# Altium schematic symbol library 724452_RPL-HX_Mobile_AEP_Rev0p91_Library.SchLib: 162 symbols (part 3 of 5)
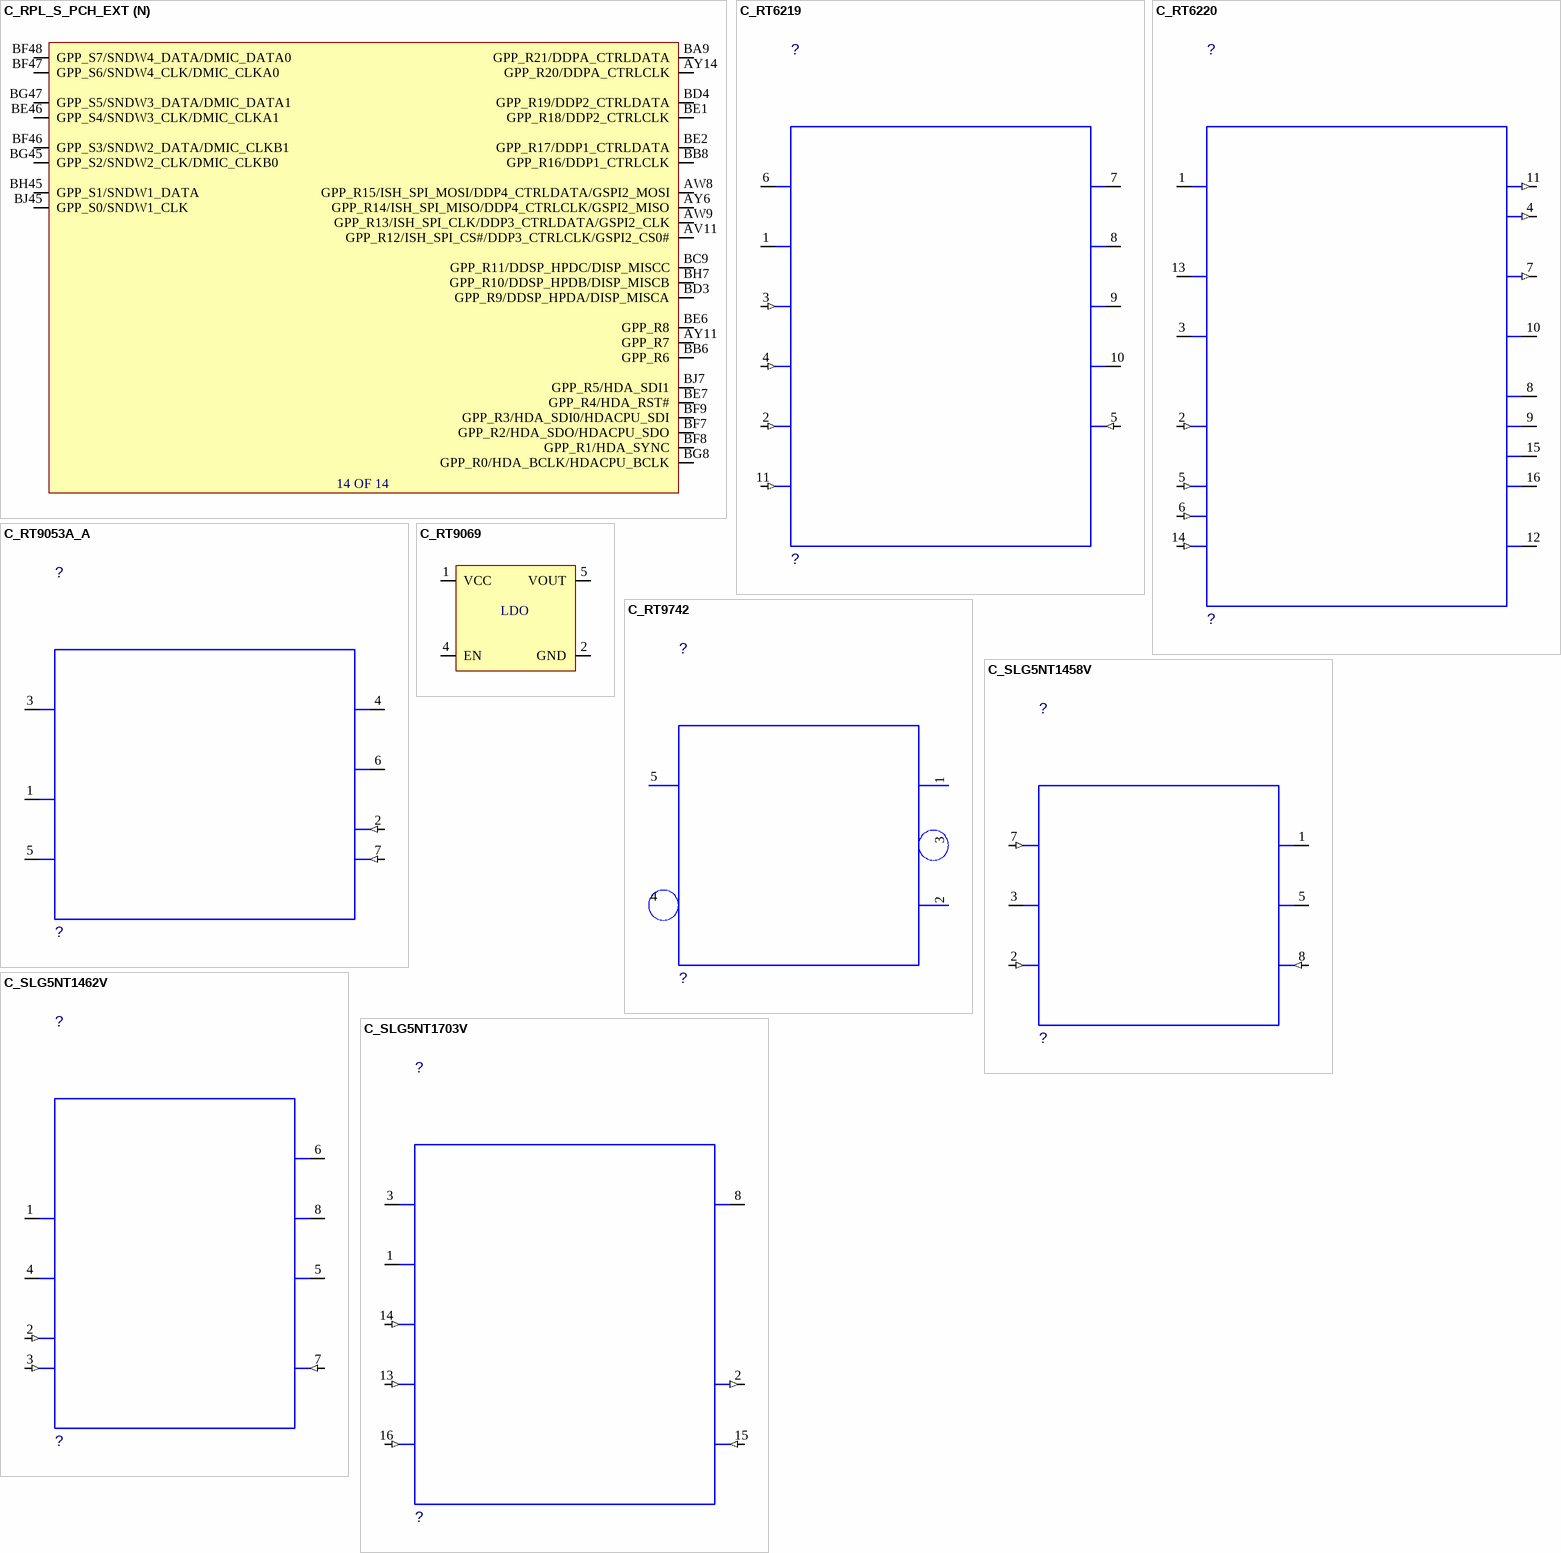
[diagram p45: symbols C_RPL_S_PCH_EXT to C_SLG5NT1703V]

## C_RPL_S_PCH_EXT
designator ?  (value not drawn)
Manufacturer Part Number: *; Case/Package: *
part A pins: A3 VSS_3, A4 VSS_5, A20 VSS_2, A31 VSS_4, A40 VSS_6, A52 VSS_7, A53 VSS_8, A54 VSS_9, AB1 VSS_10, AB5 VSS_26, AB12 VSS_11, AB13 VSS_12, AB15 VSS_13, AB20 VSS_14, AB22 VSS_15, AB23 VSS_16, AB25 VSS_17, AB26 VSS_18, AB28 VSS_19, AB30 VSS_20, AB31 VSS_21, AB33 VSS_22, AB38 VSS_23, AB40 VSS_24, AB44 VSS_25, AB55 VSS_27, AC20 VSS_28, AC22 VSS_29, AC34 VSS_30, AD5 VSS_37, AD9 VSS_39, AD11 VSS_31, AD38 VSS_32, AD40 VSS_33, AD41 VSS_34, AD43 VSS_35, AD44 VSS_36, AD51 VSS_38, AE1 VSS_40, AE22 VSS_41, AE23 VSS_42, AE34 VSS_43, AE55 VSS_44, AF5 VSS_54, AF6 VSS_56, AF8 VSS_57, AF12 VSS_45, AF13 VSS_46, AF15 VSS_47, AF16 VSS_48, AF38 VSS_49, AF40 VSS_50, AF41 VSS_51, AF43 VSS_52, AF44 VSS_53, AF51 VSS_55, AG22 VSS_58, AG23 VSS_59, AG26 VSS_60, AG28 VSS_61, AG30 VSS_62, AG31 VSS_63, AG33 VSS_64, AG34 VSS_65, AH1 VSS_66, AH12 VSS_67, AH16 VSS_68, AH22 VSS_70, AH23 VSS_71, AH26 VSS_72, AH38 VSS_73, AH40 VSS_74, AH44 VSS_75, AH55 VSS_76, AK12 VSS_77, AK20 VSS_78, AK26 VSS_79, AK28 VSS_80, AK30 VSS_81, AK31 VSS_82, AK33 VSS_83, AK34 VSS_84, AK38 VSS_85, AK40 VSS_86, AK44 VSS_87, AL5 VSS_88, AL51 VSS_89, AM12 VSS_90, AM31 VSS_91, AM40 VSS_92, AM44 VSS_93, AN1 VSS_94, AN19 VSS_95, AN21 VSS_96, AN23 VSS_97, AN25 VSS_98, AN27 VSS_99, AN31 VSS_100, AN37 VSS_103, AN55 VSS_104, AP12 VSS_105, AP16 VSS_106, AP40 VSS_107, AP44 VSS_108, AR17 VSS_109, B1 VSS_143, B2 VSS_144, B54 VSS_149, B55 VSS_150, BG7 VSS_196, BH4 VSS_198, BH5 VSS_199, BH54 VSS_200, BH55 VSS_201, BJ3 VSS_204, BJ4 VSS_205, C1 VSS_208, C55 VSS_219, D1 VSS_221, D55 VSS_235
part B pins: AV19 VSS_127, AV21 VSS_128, AV23 VSS_129, AV25 VSS_130, AV27 VSS_131, AV29 VSS_132, AV31 VSS_133, AV33 VSS_134, AV35 VSS_135, AV37 VSS_136, AV39 VSS_137, AV45 VSS_138, AW5 VSS_141, AW12 VSS_139, AW13 VSS_140, AW51 VSS_142, B4 VSS_145, B5 VSS_146, B51 VSS_147, B52 VSS_148, BB1 VSS_151, BB10 VSS_152, BB23 VSS_153, BB27 VSS_154, BB29 VSS_155, BB33 VSS_156, BB46 VSS_157, BB55 VSS_158, BC10 VSS_159, BC46 VSS_160, BD5 VSS_162, BD7 VSS_164, BD49 VSS_161, BD51 VSS_163, BE4 VSS_174, BE9 VSS_180, BE14 VSS_165, BE16 VSS_166, BE18 VSS_167, BE31 VSS_169, BE36 VSS_171, BE38 VSS_173, BE40 VSS_175, BE42 VSS_176, BE44 VSS_177, BE47 VSS_178, BE52 VSS_179, BF32 VSS_184, BF36 VSS_186, BF40 VSS_187, BF45 VSS_188, BG20 VSS_189, BG24 VSS_190, BG32 VSS_193, BG53 VSS_195, BH20 VSS_197, BJ11 VSS_202, BJ20 VSS_203, BJ40 VSS_206, BJ49 VSS_207, C3 VSS_212, C5 VSS_216, C7 VSS_220, C17 VSS_209, C27 VSS_210, C28 VSS_211, C36 VSS_213, C45 VSS_214, C49 VSS_215, C51 VSS_217, C53 VSS_218, D2 VSS_223, D7 VSS_236, D17 VSS_222, D27 VSS_224, D32 VSS_225, D33 VSS_226, D36 VSS_227, D37 VSS_228, D40 VSS_229, D42 VSS_230, D45 VSS_231, D46 VSS_232, D52 VSS_233, D54 VSS_234, E7 VSS_257, E9 VSS_258, E10 VSS_237, E14 VSS_238, E16 VSS_239, E18 VSS_240, E22 VSS_241, E23 VSS_242, E31 VSS_243, E33 VSS_244, E36 VSS_245, E37 VSS_246, E38 VSS_247, E40 VSS_248, E41 VSS_249, E42 VSS_250, E44 VSS_251, E46 VSS_252, E47 VSS_253, E49 VSS_254, E52 VSS_255, E54 VSS_256, F49 VSS_260, F51 VSS_261, G5 VSS_262, H8 VSS_272, H10 VSS_263, H27 VSS_264, H29 VSS_265, H33 VSS_267, H46 VSS_268, H48 VSS_269, H50 VSS_270, H55 VSS_271, U35 VSS_345
part C pins: A2 VSS_1, AH18 VSS_69, AN33 VSS_101, AN35 VSS_102, AR5 VSS_114, AR19 VSS_110, AR27 VSS_111, AR33 VSS_112, AR35 VSS_113, AR51 VSS_115, AT12 VSS_116, AT17 VSS_117, AT19 VSS_118, AT27 VSS_119, AT33 VSS_120, AT35 VSS_121, AT39 VSS_122, AT44 VSS_123, AU1 VSS_124, AU55 VSS_125, AV17 VSS_126, BE25 VSS_168, BE33 VSS_170, BE37 VSS_172, BF16 VSS_181, BF24 VSS_182, BF29 VSS_183, BF33 VSS_185, BG5 VSS_194, BG28 VSS_191, BG29 VSS_192, F4 VSS_259, H3 VSS_266, J9 VSS_277, J16 VSS_273, J21 VSS_274, J43 VSS_275, J47 VSS_276, K4 VSS_280, K11 VSS_278, K16 VSS_279, K42 VSS_281, K45 VSS_282, K50 VSS_283, L5 VSS_291, L12 VSS_284, L13 VSS_285, L21 VSS_286, L43 VSS_287, L44 VSS_288, L47 VSS_289, L48 VSS_290, L51 VSS_292, M5 VSS_309, M12 VSS_293, M13 VSS_294, M17 VSS_295, M23 VSS_296, M25 VSS_297, M27 VSS_298, M29 VSS_299, M31 VSS_300, M33 VSS_301, M35 VSS_302, M37 VSS_303, M39 VSS_304, M41 VSS_305, M43 VSS_306, M44 VSS_307, M45 VSS_308, N1 VSS_310, N55 VSS_311, P12 VSS_312, P23 VSS_313, P27 VSS_314, P29 VSS_315, P35 VSS_316, P39 VSS_317, P41 VSS_318, P43 VSS_319, P44 VSS_320, R5 VSS_327, R19 VSS_321, R21 VSS_322, R23 VSS_323, R27 VSS_324, R29 VSS_325, R35 VSS_326, R51 VSS_328, T5 VSS_336, T12 VSS_329, T13 VSS_330, T15 VSS_331, T16 VSS_332, T40 VSS_333, T41 VSS_334, T44 VSS_335, U2 VSS_337, U21 VSS_338, U23 VSS_339, U25 VSS_340, U27 VSS_341, U29 VSS_342, U31 VSS_343, U33 VSS_344, U37 VSS_346, U55 VSS_347, V12 VSS_348, V16 VSS_349, V18 VSS_350, V21 VSS_351, V38 VSS_352, V43 VSS_353, W5 VSS_354, W51 VSS_355, Y12 VSS_356, Y20 VSS_357, Y22 VSS_358, Y38 VSS_359, Y40 VSS_360, Y44 VSS_361
part D pins: AB34 VCCHSIO_0P82_1 (power), AB36 VCCHSIO_0P82_2 (power), AC23 VCCDUSB_0P82 (power), AC25 VCCPRIM_CORE_0P82_1 (power), AC26 VCCPRIM_CORE_0P82_2 (power), AC28 VCCPRIM_CORE_0P82_3 (power), AC30 VCCPRIM_CORE_0P82_4 (power), AC31 VCCPRIM_CORE_0P82_5 (power), AC33 VCCPRIM_CORE_0P82_6 (power), AC36 VCCHSIO_0P82_3 (power), AD15 VCCPRIM_1P05 (power), AE25 VCCPRIM_CORE_0P82_7 (power), AE26 VCCPRIM_CORE_0P82_8 (power), AE28 VCCPRIM_CORE_0P82_9 (power), AE30 VCCPRIM_CORE_0P82_10 (power), AE31 VCCPRIM_CORE_0P82_11 (power), AE33 VCCPRIM_CORE_0P82_12 (power), AE36 VCCHSIO_0P82_4 (power), AF18 VCCPGPPD (power), AG25 VCCPRIM_0P82_1 (power), AG36 VCCHSIO_0P82_5 (power), AH20 VCCPRIM_1P8_1 (power), AH25 VCCPRIM_0P82_2 (power), AH28 VCCHSIO_0P82_6 (power), AH30 VCCHSIO_0P82_7 (power), AH31 VCCHSIO_0P82_8 (power), AH33 VCCHSIO_0P82_9 (power), AH34 VCCHSIO_0P82_10 (power), AH36 VCCHSIO_0P82_11 (power), AH41 VCCSPI (power), AK16 VCCA_XTAL_PLL_1P8_1 (power), AK18 VCCA_XTAL_PLL_1P8_2 (power), AK22 VCCAHSIOPLL_1P8_1 (power), AK23 VCCAHSIOPLL_1P8_2 (power), AK25 VCCAHSIOPLL_1P8_3 (power), AK36 VCCPRIM_0P82_3 (power), AM16 VCCA_XTAL_PLL_1P8_3 (power), AM18 VCCA_XTAL_PLL_1P8_4 (power), AM21 VCCPRIM_1P8_2 (power), AM23 VCCPRIM_1P8_3 (power), AM38 VCCPGPPA (power), AR39 VCCPGPPEFK (power), AV15 VCCPGPPIR (power), AV41 VCCPRIM_3P3 (power), AV44 DCPRTC (power), BE54 VCCDSW_3P3_1 (power), BF1 DCPCNVILDO2_1 (power), BF2 DCPCNVILDO2_2 (power), BF4 DCPCNVILDO1 (power), BF54 VCCDSW_3P3_2 (power), BF55 VCCDSW_3P3_3 (power), BG1 DCPCNVILDO2_3 (power), BG3 DCPCNVILDO2_4 (power), BG55 VCCDSW_3P3_4 (power), BH1 DCPCNVILDO2_5 (power), BH2 DCPCNVILDO2_6 (power), BH51 VCCRTC_1 (power), BH52 VCCRTC_2 (power), BJ2 DCPCNVILDO2_7 (power), BJ52 VCCRTC_3 (power), BJ53 VCCRTC_4 (power), BJ54 VCCRTC_5 (power), M15 VCCA_XTAL_PLL_0P82_1 (power), P13 VCCA_XTAL_PLL_0P82_2 (power), P15 VCCA_XTAL_PLL_0P82_3 (power), P17 VCCA_XTAL_PLL_0P82_4 (power), R17 VCCA_XTAL_PLL_0P82_5 (power), T43 VCCPGPPGH (power), U19 VCCA_XTAL_PLL_0P82_6 (power), V23 VCCHSIO_0P82_12 (power), V25 VCCHSIO_0P82_13 (power), V27 VCCHSIO_0P82_14 (power), V29 VCCHSIO_0P82_15 (power), V31 VCCHSIO_0P82_16 (power), V33 VCCHSIO_0P82_17 (power), V35 VCCHSIO_0P82_18 (power), Y23 VCCHSIO_0P82_19 (power), Y25 VCCHSIO_0P82_20 (power), Y26 VCCHSIO_0P82_21 (power), Y28 VCCHSIO_0P82_22 (power), Y30 VCCHSIO_0P82_23 (power), Y31 VCCHSIO_0P82_24 (power), Y33 VCCHSIO_0P82_25 (power), Y34 VCCHSIO_0P82_26 (power), Y36 VCCHSIO_0P82_27 (power), Y41 VCCPGPPBC (power)
part E pins: AA2 PCH_JTAG_TDI, AA3 PCH_JTAG_TDO, AA4 PCH_JTAG_TCK, AB16 RSVD_1, AB18 RSVD_2, AC3 TRIGGER_IN, AC4 PCH_JTAG_TMS, AD3 PREQ#, AD4 PCH_JTAGX, AD12 RSVD_18, AD13 RSVD_19, AE2 PRDY#, AE3 TRIGGER_OUT, AE20 RSVD_3, AF3 DBG_PMODE, AF4 CPU_TRST#, AG20 RSVD_4, AJ45 SPI0_CLK, AJ47 SPI0_CS2#, AK6 GPD7, AK8 GPD3/PWRBTN#, AK41 SPI0_MISO, AK43 SPI0_IO3, AK48 SPI0_MOSI, AK50 SPI0_IO2, AM9 DRAM_RESET#, AM11 GPD5/SLP_S4#, AM25 RSVD_5, AM27 RSVD_6, AM33 RSVD_8, AM35 RSVD_9, AM41 SPI0_CS0#, AM43 SPI0_CS1#, AN2 GPD2/LAN_WAKE#, AN3 GPD0/BATLOW#, AN4 GPD10/SLP_S5#, AN5 GPD12, AN6 PCH_PWROK, AN8 DSW_PWROK, AP4 GPD4/SLP_S3#, AP5 GPD1/ACPRESENT, AP13 GPD8/SUSCLK, AP15 GPD9/SLP_WLAN#, AR3 GPD11/LANPHYPC, AR4 GPD6/SLP_A#, AR9 SLP_LAN#, AR11 SLP_SUS#, AT3 HDACPU_BCLK, AT4 HDACPU_SDO, AT13 WAKE#, AT15 RSMRST#, AU4 SRTCRST#, AU5 HDACPU_SDI, AU52 SYS_RESET#, AV2 RTCX2, AV3 RTCX1, AV5 CL_CLK, AV13 INTRUDER#, AV53 CL_RST#, AV54 SYS_PWROK, AW3 CL_DATA, AW4 RTCRST#, BE55 SNDW_RCOMP, P37 RSVD_13, R37 RSVD_16, R39 RSVD_17, U4 CPUPWRGD, U5 C10_WAKE, V3 PECI, V4 PM_DOWN, W4 VCCST_OVERRIDE, Y3 PLTRST_CPU#, Y4 THRMTRIP#, Y5 PM_SYNC
part F pins: A11 USB2P_7, A16 USB2N_2, A25 USB32_7_TXP, B11 USB2N_7, B15 USB2P_2, B20 USB32_3_TXP, B24 USB32_7_TXN, B28 USB32_COMP, C9 USB2_COMP1, C11 USB2N_8, C12 USB2N_5, C14 USB2P_4, C15 USB2N_1, C18 USB32_1_TXN, C20 USB32_3_TXN, C21 USB32_5_TXN, C23 USB32_6_TXN, C24 USB32_8_TXP, C26 USB32_10_TXP, D4 USB2N_9, D9 USB2_COMP2, D10 USB2P_8, D11 USB2N_6, D12 USB2P_5, D13 USB2N_4, D14 USB2P_3, D16 USB2P_1, D18 USB32_1_TXP, D19 USB32_2_TXP, D20 USB32_4_TXP, D21 USB32_5_TXP, D22 USB32_6_TXP, D23 USB32_8_TXN, D24 USB32_9_TXN, D26 USB32_10_TXN, E1 USB_ID1, E2 USB_ID2, E4 USB2P_9, E6 USB2N_10, E12 USB2P_6, E15 USB2N_3, E19 USB32_2_TXN, E20 USB32_4_TXN, E25 USB32_9_TXP, F5 USB2P_10, F7 USB2N_11, F12 USB32_1_RXN, F14 USB32_3_RXN, F17 USB32_5_RXP, F20 USB32_7_RXP, F23 USB32_9_RXN, G9 USB2P_12, G10 USB2N_12, H6 USB2P_11, H13 USB32_1_RXP, H15 USB32_3_RXP, H18 USB32_5_RXN, H20 USB32_7_RXN, H23 USB32_9_RXP, J13 USB32_2_RXP, J18 USB32_4_RXP, J24 USB32_10_RXN, K6 USB2P_14, K14 USB32_2_RXN, L8 USB2N_14, L9 USB2N_13, L19 USB32_4_RXN, L24 USB32_10_RXP, M11 USB2P_13, M19 USB32_6_RXP, M21 USB32_8_RXN, P19 USB32_6_RXN, P21 USB32_8_RXP, P25 RSVD_11, R25 RSVD_14
part G pins: A36 PCIE26_TXP, AM29 RSVD_7, AN29 RSVD_10, AR21 PCIE2_RXN, AR23 PCIE3_RXP, AR25 PCIE6_RXN, AR29 PCIE9_RXN, AR31 PCIE12_RXP, AR37 PCIE19_RXN/SATA6_RXN, AT21 PCIE2_RXP, AT23 PCIE3_RXN, AT25 PCIE6_RXP, AT29 PCIE9_RXP, AT31 PCIE12_RXN, AT37 PCIE19_RXP/SATA6_RXP, AW24 PCIE5_RXP, AW27 PCIE8_RXP, AW29 PCIE10_RXP, AW32 PCIE13_RXP/SATA0_RXP, AW35 PCIE15_RXN/SATA2_RXN, AW37 PCIE17_RXN/SATA4_RXN, B32 PCIE23_TXN, B36 PCIE26_TXN, BA24 PCIE5_RXN, BA27 PCIE8_RXN, BA29 PCIE10_RXN, BA32 PCIE13_RXN/SATA0_RXN, BA35 PCIE15_RXP/SATA2_RXP, BA38 PCIE17_RXP/SATA4_RXP, BB20 PCIE1_RXP, BB36 PCIE16_RXP/SATA3_RXP, BB38 PCIE18_RXP/SATA5_RXP, BB41 PCIE20_RXN/SATA7_RXN, BD20 PCIE1_RXN, BD23 PCIE4_RXP, BD27 PCIE7_RXP, BD29 PCIE11_RXP, BD33 PCIE14_RXP/SATA1_RXP, BD36 PCIE16_RXN/SATA3_RXN, BD39 PCIE18_RXN/SATA5_RXN, BD42 PCIE20_RXP/SATA7_RXP, BE20 PCIE1_TXP, BE22 PCIE4_RXN, BE23 PCIE4_TXN, BE27 PCIE7_RXN, BE29 PCIE11_RXN, BE34 PCIE14_RXN/SATA1_RXN, BE41 PCIE18_TXN/SATA5_TXN, BF20 PCIE1_TXN, BF21 PCIE2_TXN, BF22 PCIE3_TXN, BF23 PCIE4_TXP, BF26 PCIE6_TXP, BF27 PCIE7_TXN, BF30 PCIE9_TXP, BF34 PCIE11_TXP, BF35 PCIE12_TXN, BF37 PCIE14_TXN/SATA1_TXN, BF38 PCIE15_TXN/SATA2_TXN, BF39 PCIE16_TXP/SATA3_TXP, BF42 PCIE18_TXP/SATA5_TXP, BF43 PCIE19_TXP/SATA6_TXP, BF44 PCIE20_TXP/SATA7_TXP, BG21 PCIE2_TXP, BG23 PCIE3_TXP, BG26 PCIE6_TXN, BG27 PCIE7_TXP, BG30 PCIE9_TXN, BG33 PCIE11_TXN, BG35 PCIE12_TXP, BG36 PCIE14_TXP/SATA1_TXP, BG38 PCIE15_TXP/SATA2_TXP, BG39 PCIE16_TXN/SATA3_TXN, BG41 PCIE17_TXN/SATA4_TXN, BG42 PCIE19_TXN/SATA6_TXN, BG44 PCIE20_TXN/SATA7_TXN, BH6 PCIE_RCOMP2, BH24 PCIE5_TXP, BH28 PCIE8_TXP, BH32 PCIE10_TXP, BH36 PCIE13_TXN/SATA0_TXN, BH41 PCIE17_TXP/SATA4_TXP, BJ5 PCIE_RCOMP5, BJ25 PCIE5_TXN, BJ28 PCIE8_TXN, BJ31 PCIE10_TXN, BJ36 PCIE13_TXP/SATA0_TXP, C29 PCIE21_TXN, C30 PCIE22_TXP, C32 PCIE23_TXP, C33 PCIE24_TXP, C35 PCIE25_TXN, C38 PCIE27_TXN, C39 PCIE28_TXP, D29 PCIE21_TXP, D30 PCIE22_TXN, D34 PCIE24_TXN, D35 PCIE25_TXP, D38 PCIE27_TXP, D39 PCIE28_TXN, E27 PCIE21_RXP, E29 PCIE24_RXP, E34 PCIE27_RXP, F27 PCIE21_RXN, F29 PCIE24_RXN, F33 PCIE27_RXN, J27 PCIE22_RXN, J29 PCIE23_RXP, J32 PCIE26_RXP, J35 PCIE28_RXP, L27 PCIE22_RXP, L29 PCIE23_RXN, L32 PCIE26_RXN, L35 PCIE28_RXN, P33 PCIE25_RXP, R33 PCIE25_RXN
part H pins: A28 DMI_RCOMP, A45 DMI4_TXN, A49 DMI1_TXP, A51 DMI0_TXN, AW19 CNV_WR_CLKN, AW21 CNV_WR_D0N, B41 DMI7_TXP, B45 DMI4_TXP, B49 DMI1_TXN, B50 DMI0_TXP, BA18 CNV_WR_CLKP, BA21 CNV_WR_D0P, BB18 CNV_WR_D1N, BD17 CNV_WR_D1P, BE19 CNV_WT_D1P, BF17 CNV_WT_CLKN, BF18 CNV_WT_D0N, BF19 CNV_WT_D1N, BG17 CNV_WT_CLKP, BG18 CNV_WT_D0P, C41 DMI7_TXN, C42 DMI6_TXP, C44 DMI5_TXN, C47 DMI3_TXP, C48 DMI2_TXP, D43 DMI6_TXN, D44 DMI5_TXP, D47 DMI3_TXN, D48 DMI2_TXN, D49 DMI0_RXN, E50 DMI0_RXP, F36 DMI7_RXN, F39 DMI5_RXP, F42 DMI3_RXN, F44 DMI2_RXP, G46 DMI1_RXN, G47 DMI1_RXP, H36 DMI7_RXP, H38 DMI5_RXN, H41 DMI3_RXP, H43 DMI2_RXN, J38 DMI6_RXN, J40 DMI4_RXP, K40 DMI4_RXN, L37 DMI6_RXP, P31 RSVD_12, R31 RSVD_15
part I pins: A5 CLKOUT_CPUPCIBCLK_N, A7 CLKOUT_CPUBCLK_P, AA9 CLKOUT_PCIE_N14, AA11 CLKOUT_PCIE_P14, AD6 XTAL_IN, AD8 XTAL_OUT, AD16 GPP_D14/SRCCLKREQ7#, AD18 GPP_D13/SRCCLKREQ6#, AG3 GPP_D12/SRCCLKREQ5#, AG4 GPP_D0/SRCCLKREQ0#, AH15 GPP_D1/SRCCLKREQ1#, AJ9 GPP_D2/SRCCLKREQ2#, AK5 GPP_D3/SRCCLKREQ3#, AK13 GPP_D11/SRCCLKREQ4#, B6 CLKOUT_CPUPCIBCLK_P, B7 CLKOUT_CPUBCLK_N, BA4 GPP_J8/SRCCLKREQ16#, BB3 GPP_J9/SRCCLKREQ17#, C8 CLKOUT_CPUNSSC_P, D8 CLKOUT_CPUNSSC_N, F3 CLKOUT_PCIE_N4, G4 CLKOUT_PCIE_P4, H1 CLKOUT_PCIE_P5, H2 CLKOUT_PCIE_N5, H4 CLKOUT_PCIE_P9, H54 GPP_H6/SRCCLKREQ12#, J3 CLKOUT_PCIE_N8, J4 CLKOUT_PCIE_P8, J5 CLKOUT_PCIE_N9, J52 GPP_H0, K52 GPP_H3/SRCCLKREQ9#, L3 CLKOUT_PCIE_P10, L4 CLKOUT_PCIE_N10, L53 GPP_H5/SRCCLKREQ11#, M2 CLKOUT_PCIE_P11, M3 CLKOUT_PCIE_N11, N4 CLKOUT_PCIE_N12, N5 CLKOUT_PCIE_P12, N6 CLKOUT_PCIE_P1, N50 GPP_H7/SRCCLKREQ13#, P3 CLKOUT_PCIE_P13, P4 CLKOUT_PCIE_N13, P8 CLKOUT_PCIE_N1, P48 GPP_H9/SRCCLKREQ15#, R3 CLKOUT_PCIE_N16, R4 CLKOUT_PCIE_P16, R9 CLKOUT_PCIE_P0, R11 CLKOUT_PCIE_N0, R47 GPP_H8/SRCCLKREQ14#, T4 CLKOUT_PCIE_P17, U1 CLKOUT_CPURTC, U3 CLKOUT_PCIE_N17, U6 CLKOUT_CPUBCLK2_P, U8 CLKOUT_CPUBCLK2_N, V9 CLKOUT_PCIE_P3, V11 CLKOUT_PCIE_N3, V13 CLKOUT_PCIE_N2, V15 CLKOUT_PCIE_P2, V44 GPP_H4/SRCCLKREQ10#, V47 GPP_H2/SRCCLKREQ8#, Y6 CLKOUT_PCIE_N15, Y8 CLKOUT_PCIE_P15, Y13 CLKOUT_PCIE_N6, Y15 CLKOUT_PCIE_P6, Y16 CLKOUT_PCIE_P7, Y18 CLKOUT_PCIE_N7
part J pins: AA45 GPP_B16/ISH_GP4, AA47 GPP_B2/VRALERT#, AA52 GPP_B15/ISH_GP3, AA53 GPP_B19/RSVD, AA54 GPP_B23/SML1ALERT#/PCHHOT#, AB51 GPP_B6/CLKOUT_48, AC52 GPP_B0/PCIE_LNK_DOWN, AC53 GPP_B11, AK51 GPP_A8/ESPI_CS2#, AK52 GPP_A14, AK53 GPP_A6/ESPI_RESET#, AL52 GPP_A7/ESPI_CS1#, AM45 GPP_A1/ESPI_IO1, AM47 GPP_A3/ESPI_IO3/SUSACK#, AM52 GPP_A10/ESPI_ALERT0#, AM53 GPP_A12/ESPI_ALERT2#, AN48 GPP_A13/ESPI_ALERT3#, AN50 GPP_A5/ESPI_CLK, AN51 GPP_A2/ESPI_IO2/SUSWARN#/SUSPWRDNACK, AN52 GPP_A4/ESPI_CS0#, AN54 GPP_A0/ESPI_IO0, AP41 GPP_A9/ESPI_CS3#, AP43 GPP_A11/ESPI_ALERT1#, T51 GPP_B22, T52 GPP_B20/RSVD, U51 GPP_B3/CPU_GP2, U52 GPP_B17/ISH_GP5, U53 GPP_B1/ISH_UART0_RTS#/GSPI2_CS1#, U54 GPP_B7/ISH_GP7, V40 GPP_B9/ISH_GP1, V41 GPP_B8/ISH_GP0, V52 GPP_B18/PMCALERT#, V53 GPP_B12/SLP_S0#, W52 GPP_B14/SPKR, Y48 GPP_B4/CPU_GP3, Y50 GPP_B10/ISH_GP2, Y51 GPP_B5/SX_EXIT_HOLDOFF#/ISH_GP6, Y52 GPP_B13/PLTRST#, Y53 GPP_B21
part K pins: AB41 GPP_C5/SML0ALERT#, AB43 GPP_C4/ISH_UART0_TXD/I2C2_SCL, AD45 GPP_C7/ISH_I2C2_SCL/I2C3_SCL, AD47 GPP_C6/ISH_I2C2_SDA/I2C3_SDA, AD48 GPP_C18/I2C1_SDA, AD50 GPP_C19/I2C1_SCL, AD52 GPP_C11/UART0_CTS#, AD53 GPP_C2/SMBALERT#, AE53 GPP_C0/SMBCLK, AE54 GPP_C1/SMBDATA, AF9 GPP_D19/GSPI3_MOSI, AF11 GPP_D16/GSPI3_CS0#, AF45 GPP_C13/UART1_TXD/ISH_UART1_TXD, AF47 GPP_C10/UART0_RTS#, AF48 GPP_C8/UART0_RXD, AF50 GPP_C20/UART2_RXD, AF52 GPP_C9/UART0_TXD, AF53 GPP_C14/UART1_RTS#/ISH_UART1_RTS#, AG52 GPP_C21/UART2_TXD, AG53 GPP_C15/UART1_CTS#/ISH_UART1_CTS#, AH5 GPP_D21/UART3_TXD, AH13 GPP_D17/GSPI3_CLK, AH43 GPP_C23/UART2_CTS#, AH51 GPP_C22/UART2_RTS#, AJ2 GPP_D6/MODEM_CLKREQ, AJ3 GPP_D8, AJ4 GPP_D7, AJ11 GPP_D23/UART3_CTS#, AJ52 GPP_C12/UART1_RXD/ISH_UART1_RXD, AJ53 GPP_C17/I2C0_SCL, AJ54 GPP_C16/I2C0_SDA, AK3 GPP_D15/SML1DATA, AK4 GPP_D5/CNV_RF_RESET#, AK15 GPP_D18/GSPI3_MISO, AL4 GPP_D4/SML1CLK, AM3 GPP_D20/UART3_RXD, AM4 GPP_D22/UART3_RTS#, AM13 GPP_D9/SML0CLK, AM15 GPP_D10/SML0DATA, AY40 GPP_E2/SATAXPCIE2/SATAGP2, BA40 GPP_E9/USB_OC0#, BA43 GPP_E10/USB_OC1#, BA47 GPP_E5/SATA_DEVSLP1, BB43 GPP_E3/CPU_GP0, BB53 GPP_E0/SATAXPCIE0/SATAGP0, BC47 GPP_E12/USB_OC3#, BC51 GPP_E21/ISH_UART0_CTS#, BC52 GPP_E6/SATA_DEVSLP2, BD44 GPP_E1/SATAXPCIE1/SATAGP1, BD52 GPP_E4/SATA_DEVSLP0, BD53 GPP_E7/CPU_GP1, BE49 GPP_E18, BE50 GPP_E20, BF49 GPP_E15/SBK2/BK2, BF52 GPP_E19, BG48 GPP_E17, BG49 GPP_E13/SBK0/BK0, BG51 GPP_E11/USB_OC2#, BH49 GPP_E16/SBK3/BK3, BH50 GPP_E14/SBK1/BK1, BJ51 GPP_E8/SATALED#/SPI1_CS1#, Y43 GPP_C3/ISH_UART0_RXD/I2C2_SDA
part L pins: AN53 GPP_F23, AP51 GPP_F17, AP52 GPP_F21/EDP_BKLTCTL, AR45 GPP_F13/SATA_SDATAOUT0, AR47 GPP_F12/SATA_SDATAOUT1, AR52 GPP_F8/SATA_DEVSLP6, AR53 GPP_F1/SATAXPCIE4/SATAGP4, AT41 GPP_F9/SATA_DEVSLP7, AT43 GPP_F11/SATA_SLOAD, AT48 GPP_F20/EDP_BKLTEN, AT52 GPP_F16, AT53 GPP_F7/SATA_DEVSLP5, AU50 GPP_F14/PS_ON#, AU51 GPP_F2/SATAXPCIE5/SATAGP5, AV43 GPP_F0/SATAXPCIE3/SATAGP3, AW43 GPP_F10/SATA_SCLOCK, AW44 GPP_F5/SATA_DEVSLP3, AW47 GPP_F4/SATAXPCIE7/SATAGP7, AW48 GPP_F18, AY42 GPP_F15, AY45 GPP_F19/EDP_VDDEN, AY50 GPP_F6/SATA_DEVSLP4, BB48 GPP_F3/SATAXPCIE6/SATAGP6, BB50 GPP_F22/VNN_CTRL, E55 GPP_H17/SML4DATA, F52 GPP_H16/SML4CLK, F53 GPP_H18/SML4ALERT#, G51 GPP_H13/SML3CLK, G52 GPP_H14/SML3DATA, H52 GPP_H10/SML2CLK, H53 GPP_H15/SML3ALERT#, J51 GPP_H11/SML2DATA, J53 GPP_H12/SML2ALERT#, L52 GPP_H1, M51 GPP_H23/TIME_SYNC0, M53 GPP_G2/DNX_FORCE_RELOAD, M54 GPP_G7, N51 GPP_G4, N52 GPP_G6, P52 GPP_G1, P53 GPP_G5/SLP_DRAM#, R45 GPP_H21/ISH_I2C1_SDA/SMI#, R52 GPP_G0, R53 GPP_G3, U48 GPP_H19/ISH_I2C0_SDA, U50 GPP_H20/ISH_I2C0_SCL, V45 GPP_H22/ISH_I2C1_SCL/NMI#
part M pins: AT8 GPP_J10/BSSB_LS_RX, AU6 GPP_J2/CNV_BRI_DT/UART0_RTS#, AV12 GPP_J6/CNV_MFUART2_RXD, AV51 GPP_K5/ADR_COMPLETE, AW52 GPP_K8/CORE_VID0, AW53 GPP_K9/CORE_VID1, AY4 GPP_J11/BSSB_LS_TX, AY16 GPP_I12/USB_OC5#/I2C4_SCL, AY52 GPP_K2/GSXDIN, BA3 GPP_J1/CPU_C10_GATE#, BA5 GPP_J3/CNV_BRI_RSP/UART0_RXD, BA13 GPP_I4/DDSP_HPD4/DISP_MISC4, BA16 GPP_I11/USB_OC4#/I2C4_SDA, BA51 GPP_K3/GSXSRESET#, BA52 GPP_K0/GSXDOUT, BA53 GPP_K1/GSXSLOAD, BB2 GPP_J0/CNV_PA_BLANKING, BB4 GPP_J7/CNV_MFUART2_TXD, BB13 GPP_I13/USB_OC6#/I2C5_SDA, BB15 GPP_I3/DDSP_HPD3/DISP_MISC3, BB52 GPP_K4/GSXCLK, BB54 GPP_K11, BC4 GPP_J5/CNV_RGI_RSP/UART0_CTS#, BC5 GPP_J4/CNV_RGI_DT/UART0_TXD, BD12 GPP_I14/USB_OC7#/I2C5_SCL, BD14 GPP_I2/DDSP_HPD2/DISP_MISC2, BE10 GPP_I8/DDPC_CTRLDATA, BE12 GPP_I18/GSPI0_MOSI, BE15 GPP_I20/GSPI1_CLK, BF10 GPP_I17/GSPI0_MISO, BF11 GPP_I15/GSPI0_CS0#, BF12 GPP_I5/DDPB_CTRLCLK, BF13 GPP_I21/GSPI1_MISO, BF14 GPP_I10/GSPI1_CS1#/TIME_SYNC1, BG9 GPP_I7/DDPC_CTRLCLK, BG11 GPP_I9/GSPI0_CS1#, BG12 GPP_I6/DDPB_CTRLDATA, BG14 GPP_I19/GSPI1_CS0#, BG15 GPP_I22/GSPI1_MOSI, BH11 GPP_I16/GSPI0_CLK, BH15 GPP_I1/DDSP_HPD1/DISP_MISC1, BJ16 GPP_I0/RSVD
part N pins: AV11 GPP_R12/ISH_SPI_CS#/DDP3_CTRLCLK/GSPI2_CS0#, AW8 GPP_R15/ISH_SPI_MOSI/DDP4_CTRLDATA/GSPI2_MOSI, AW9 GPP_R13/ISH_SPI_CLK/DDP3_CTRLDATA/GSPI2_CLK, AY6 GPP_R14/ISH_SPI_MISO/DDP4_CTRLCLK/GSPI2_MISO, AY11 GPP_R7, AY14 GPP_R20/DDPA_CTRLCLK, BA9 GPP_R21/DDPA_CTRLDATA, BB6 GPP_R6, BB8 GPP_R16/DDP1_CTRLCLK, BC9 GPP_R11/DDSP_HPDC/DISP_MISCC, BD3 GPP_R9/DDSP_HPDA/DISP_MISCA, BD4 GPP_R19/DDP2_CTRLDATA, BE1 GPP_R18/DDP2_CTRLCLK, BE2 GPP_R17/DDP1_CTRLDATA, BE6 GPP_R8, BE7 GPP_R4/HDA_RST#, BE46 GPP_S4/SNDW3_CLK/DMIC_CLKA1, BF7 GPP_R2/HDA_SDO/HDACPU_SDO, BF8 GPP_R1/HDA_SYNC, BF9 GPP_R3/HDA_SDI0/HDACPU_SDI, BF46 GPP_S3/SNDW2_DATA/DMIC_CLKB1, BF47 GPP_S6/SNDW4_CLK/DMIC_CLKA0, BF48 GPP_S7/SNDW4_DATA/DMIC_DATA0, BG8 GPP_R0/HDA_BCLK/HDACPU_BCLK, BG45 GPP_S2/SNDW2_CLK/DMIC_CLKB0, BG47 GPP_S5/SNDW3_DATA/DMIC_DATA1, BH7 GPP_R10/DDSP_HPDB/DISP_MISCB, BH45 GPP_S1/SNDW1_DATA, BJ7 GPP_R5/HDA_SDI1, BJ45 GPP_S0/SNDW1_CLK
part A text: 1 OF 14
part B text: 2 OF 14
part C text: 3 OF 14
part D text: 4 OF 14
part E text: 5 OF 14
part F text: 6 OF 14
part G text: 7 OF 14
part H text: 8 OF 14
part I text: 9 OF 14
part J text: 10 OF 14
part K text: 11 OF 14
part L text: 12 OF 14
part M text: 13 OF 14
part N text: 14 OF 14

## C_RT6219
designator ?  (value not drawn)
CDS_LMAN_SYM_OUTLINE: -250,350,250,-350; ROOM: NONE; OriginalSymbolOrigin: (-275,350); FP_TECH: ?; IP: ?; MATERIAL: ?; PACK_TYPE: ?; PART_NUMBER: ?; VARIANT: ?
pins: 1 PGOOD (io), 2 VBYP (in), 3 VIN (in), 4 EN (in), 5 FB (in), 6 VCC (power), 7 BOOT (io), 8 SW_1 (io), 9 SW_2 (io), 10 SW_3 (io), 11 PGND_TPD (in)

## C_RT6220
designator ?  (value not drawn)
CDS_LMAN_SYM_OUTLINE: -250,400,250,-400; ROOM: NONE; OriginalSymbolOrigin: (-275,400); FP_TECH: ?; IP: ?; MATERIAL: ?; PACK_TYPE: ?; PART_NUMBER: ?; VARIANT: ?
pins: 1 VIN (power), 2 PGND (in), 3 VBYP (io), 4 PGOOD (out), 5 AGND_1 (in), 6 AGND_2 (in), 7 VOUT (out), 8 SW_1 (io), 9 SW_2 (io), 10 BOOT (io), 11 VCC (out), 12 FB (io), 13 EN (io), 14 AGND_3 (in), 15 SW_TPD_1 (io), 16 SW_TPD_2 (io)

## C_RT9053A_A
designator ?  (value not drawn)
CDS_LMAN_SYM_OUTLINE: -250,250,250,-200; ROOM: NONE; OriginalSymbolOrigin: (-275,250); FP_TECH: ?; IP: ?; PACK_TYPE: ?; VARIANT: ?; MATERIAL: ?; PART_NUMBER: ?
pins: 1 EN (io), 2 GND (in), 3 VIN (power), 4 VOUT (power), 5 NC (io), 6 FB (io), 7 GND_TPD (in)

## C_RT9069
designator ?  (value not drawn)
LDO,Vin 37V, Vout 3.3V, 200mA SOT-23-5; Manufacturer Part Number: RT9069-33GB; Case/Package: SOT-23-5
pins: 1 VCC, 2 GND, 4 EN, 5 VOUT
text: LDO

## C_RT9742
designator ?  (value not drawn)
CDS_LMAN_SYM_OUTLINE: -200,200,200,-200; ROOM: NONE; OriginalSymbolOrigin: (-250,200); FP_TECH: ?; IP: ?; MATERIAL: ?; PACK_TYPE: ?; PART_NUMBER: ?; VARIANT: ?
pins: 1 VOUT (out), 2 GND (in), 3 FLG_N (out), 4 EN_EN_N (in), 5 VIN (in)

## C_SLG5NT1458V
designator ?  (value not drawn)
CDS_LMAN_SYM_OUTLINE: -200,200,200,-200; ROOM: NONE; OriginalSymbolOrigin: (-225,200); FP_TECH: ?; IP: ?; MATERIAL: ?; PACK_TYPE: ?; PART_NUMBER: ?; VARIANT: ?
pins: 1 VDD (power), 2 ON (in), 3 D (io), 5 S (io), 7 CAP (in), 8 GND (in)

## C_SLG5NT1462V
designator ?  (value not drawn)
CDS_LMAN_SYM_OUTLINE: -200,250,200,-300; ROOM: NONE; OriginalSymbolOrigin: (-225,250); FP_TECH: ?; IP: ?; MATERIAL: ?; PACK_TYPE: ?; PART_NUMBER: ?; VARIANT: ?
pins: 1 D2 (io), 2 ON2 (in), 3 ON1 (in), 4 D1 (io), 5 S1 (io), 6 VDD (power), 7 GND (in), 8 S2 (io)

## C_SLG5NT1703V
designator ?  (value not drawn)
CDS_LMAN_SYM_OUTLINE: -250,300,250,-300; ROOM: NONE; OriginalSymbolOrigin: (-275,300); FP_TECH: ?; IP: ?; MATERIAL: ?; PACK_TYPE: ?; PART_NUMBER: ?; VARIANT: ?
pins: 1 VDD (power), 2 PG (out), 3 VIN (power), 8 VOUT (power), 13 RESET (in), 14 CAP (in), 15 GND (in), 16 ON (in)

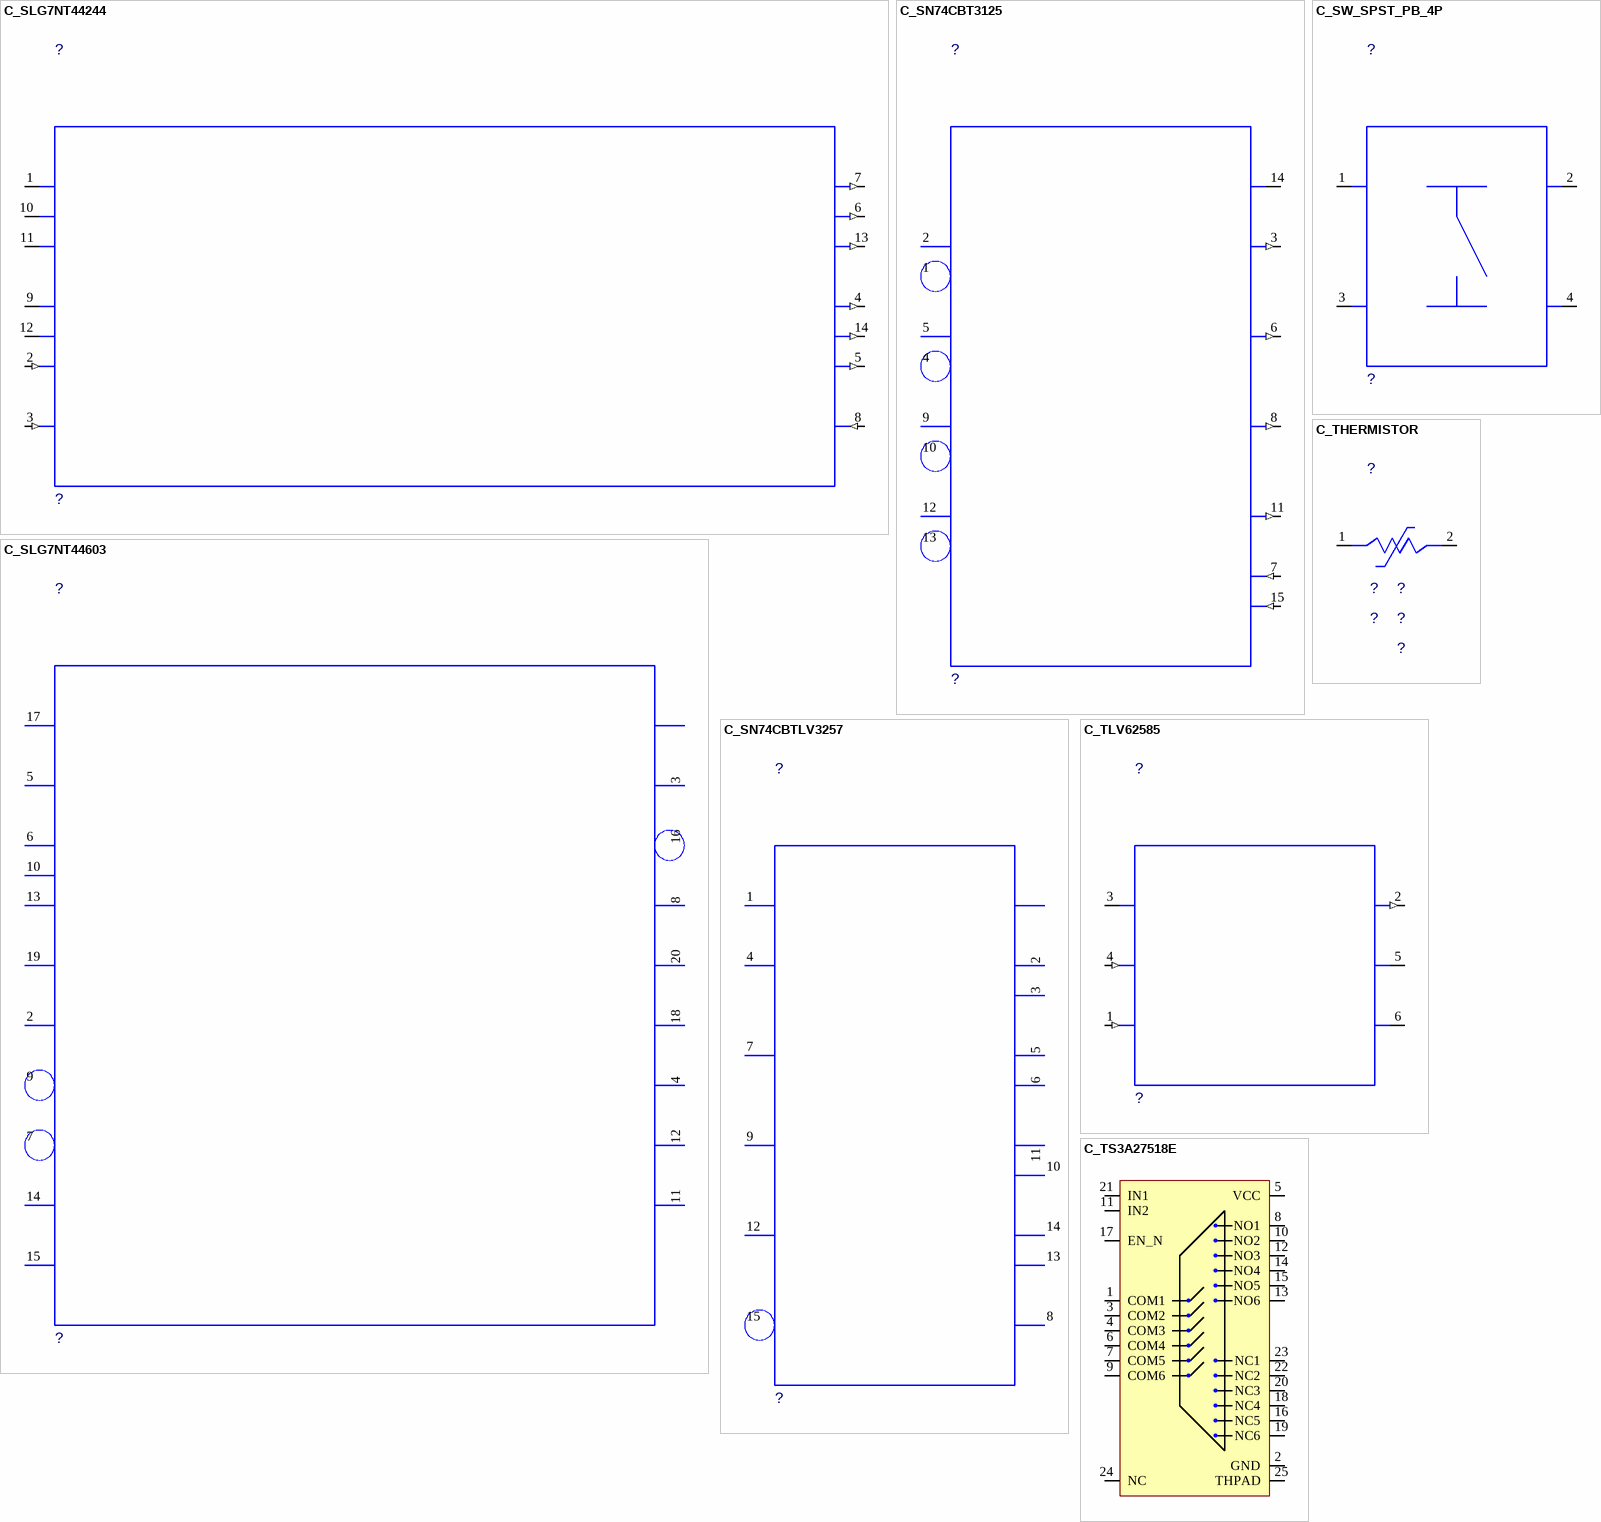
[diagram p24: symbols C_SLG7NT44244 to C_TS3A27518E]

## C_SLG7NT44244
designator ?  (value not drawn)
CDS_LMAN_SYM_OUTLINE: -650,300,650,-300; ROOM: NONE; OriginalSymbolOrigin: (-675,300); FP_TECH: ?; IP: ?; MATERIAL: ?; PACK_TYPE: ?; PART_NUMBER: ?; VARIANT: ?
pins: 1 VDD (power), 2 GPPC_A_15_PERST_R_N (in), 3 PLT_RST_N (in), 4 GPPC_A_15_PERST_N (out), 5 DGVCCSA_POWERGOOD (out), 6 V1P8_EN (out), 7 DGVCCSAMC_POWERGOOD (out), 8 GND (in), 9 P_VCCSA (io), 10 P_V1P8A_GPU (io), 11 P_VCCSAMC (io), 12 P_VDDQ_GPU (io), 13 DGVCCIO_POWERGOOD (out), 14 DGVCCDDR_POWERGOOD (out)